# Altium footprint library SMDLibrary.PcbLib: 309 footprints (part 5 of 20)
Each footprint in its own frame and in the unit in brackets; x right, y up, seen from the top. Pads: shape width x height; smd on the part's side, far side on the other; paste and mask are expansions set on the pad; w line width, h text height; cw(c..) or ccw(c..) is an arc to the next point about the centre after c.
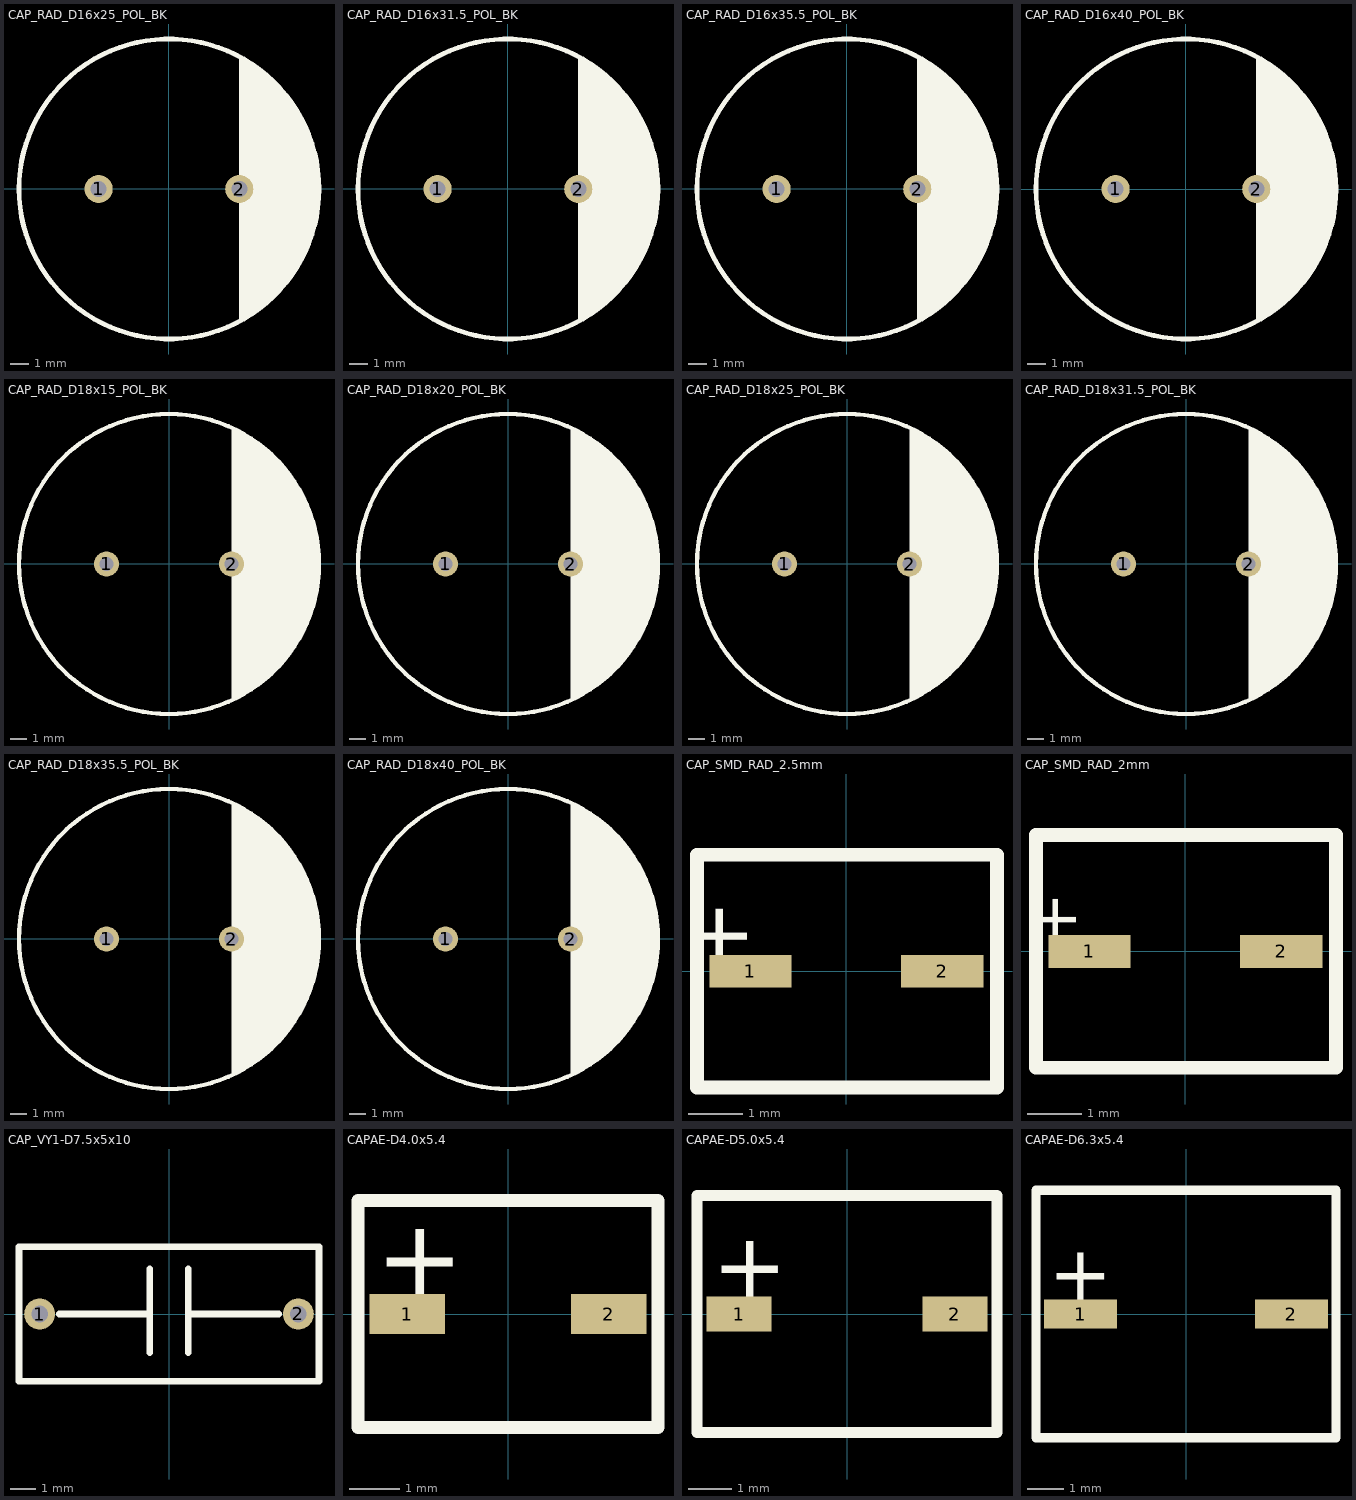
[diagram p4: the footprints below, top view; thin cyan lines are the x and y axes]

## CAP_RAD_D16x25_POL_BK [mm]
pads (2):
  round 1.5 hole 0.85: 1(-3.75,0) 2(3.75,0)
Top Overlay:
  circle w0.254: c0,0 r8
  region: 1.3,2.25
  region: 3.75,7.094 3.75,-7.058 4.067,-6.882 4.669,-6.476 5.232,-6.019 5.754,-5.514 6.229,-4.965 6.653,-4.377 7.025,-3.753 7.34,-3.1 7.597,-2.421 7.793,-1.722 7.927,-1.009 7.997,-0.287 8.001,0.076 7.995,0.435 7.919,1.148 7.781,1.851 7.583,2.54 7.324,3.209 7.008,3.852 6.636,4.465 6.213,5.043 5.74,5.582 5.221,6.078 4.662,6.525 4.065,6.923
3D body "CAP_RAD_D16x25_POL_BK.stp": height 27, standoff -2.5, extent -8.25,-8.25 8.25,8.25

## CAP_RAD_D16x31.5_POL_BK [mm]
pads (2):
  round 1.5 hole 0.85: 1(-3.75,0) 2(3.75,0)
Top Overlay:
  circle w0.254: c0,0 r8
  region: 3.75,7.094 3.75,-7.058 4.067,-6.882 4.669,-6.476 5.232,-6.019 5.754,-5.514 6.228,-4.965 6.653,-4.377 7.025,-3.753 7.34,-3.1 7.597,-2.421 7.793,-1.722 7.927,-1.009 7.997,-0.287 8.001,0.076 7.995,0.435 7.919,1.148 7.781,1.851 7.583,2.54 7.324,3.209 7.008,3.852 6.636,4.465 6.213,5.043 5.74,5.582 5.221,6.078 4.662,6.525 4.065,6.923
  region: 1.3,2.25
3D body "CAP_RAD_D16x31.5_POL_BK.stp": height 33.5, standoff -2.5, extent -8.25,-8.247 8.25,8.247

## CAP_RAD_D16x35.5_POL_BK [mm]
pads (2):
  round 1.5 hole 0.85: 1(-3.75,0) 2(3.75,0)
Top Overlay:
  circle w0.254: c0,0 r8
  region: 3.75,7.094 3.75,-7.058 4.067,-6.882 4.669,-6.476 5.232,-6.019 5.754,-5.514 6.229,-4.965 6.653,-4.377 7.025,-3.753 7.34,-3.1 7.597,-2.421 7.793,-1.722 7.927,-1.009 7.997,-0.287 8.001,0.076 7.995,0.435 7.919,1.148 7.781,1.851 7.583,2.54 7.324,3.209 7.008,3.852 6.636,4.465 6.213,5.043 5.74,5.582 5.221,6.078 4.662,6.525 4.065,6.923
  region: 1.3,2.25
3D body "CAP_RAD_D16x35.5_POL_BK.stp": height 37.5, standoff -2.5, extent -8.25,-8.246 8.25,8.246

## CAP_RAD_D16x40_POL_BK [mm]
pads (2):
  round 1.5 hole 0.85: 1(-3.75,0) 2(3.75,0)
Top Overlay:
  circle w0.254: c0,0 r8
  region: 3.75,7.094 3.75,-7.058 4.068,-6.882 4.669,-6.476 5.233,-6.019 5.754,-5.514 6.229,-4.965 6.653,-4.376 7.025,-3.753 7.34,-3.099 7.597,-2.421 7.793,-1.722 7.927,-1.009 7.998,-0.286 8.001,0.076 7.995,0.435 7.919,1.148 7.782,1.851 7.583,2.54 7.324,3.209 7.008,3.852 6.636,4.465 6.213,5.044 5.74,5.582 5.221,6.078 4.662,6.526 4.065,6.923
  region: 1.3,2.25
3D body "CAP_RAD_D16x40_POL_BK.stp": height 42, standoff -2.5, extent -8.25,-8.248 8.25,8.248

## CAP_RAD_D18x15_POL_BK [mm]
pads (2):
  round 1.5 hole 0.85: 1(-3.75,0) 2(3.75,0)
Top Overlay:
  circle w0.254: c0,0 r9
  region: 1.3,2.25
  region: 3.75,8.179 3.75,-8.179 4.137,-7.996 4.874,-7.559 5.566,-7.054 6.208,-6.487 6.793,-5.861 7.316,-5.183 7.773,-4.458 8.16,-3.694 8.472,-2.896 8.708,-2.073 8.866,-1.231 8.943,-0.378 8.941,0.051 8.94,0.475 8.859,1.321 8.699,2.154 8.46,2.969 8.146,3.758 7.758,4.513 7.301,5.229 6.779,5.898 6.196,6.515 5.557,7.074 4.868,7.571 4.135,8
3D body "CAP_RAD_D18x15_POL_BK.stp": height 16.5, standoff -2.5, extent -9.25,-9.25 9.25,9.25

## CAP_RAD_D18x20_POL_BK [mm]
pads (2):
  round 1.5 hole 0.85: 1(-3.75,0) 2(3.75,0)
Top Overlay:
  circle w0.254: c0,0 r9
  region: 1.3,2.25
  region: 3.75,8.179 3.75,-8.179 4.137,-7.996 4.874,-7.559 5.566,-7.054 6.208,-6.487 6.793,-5.861 7.316,-5.183 7.773,-4.458 8.16,-3.694 8.472,-2.896 8.708,-2.073 8.866,-1.231 8.943,-0.378 8.941,0.051 8.94,0.475 8.859,1.32 8.699,2.154 8.46,2.969 8.146,3.758 7.758,4.513 7.301,5.229 6.779,5.898 6.196,6.515 5.557,7.074 4.868,7.571 4.135,8
3D body "CAP_RAD_D18x20_POL_BK.stp": height 22, standoff -2.5, extent -9.25,-9.25 9.25,9.25

## CAP_RAD_D18x25_POL_BK [mm]
pads (2):
  round 1.5 hole 0.85: 1(-3.75,0) 2(3.75,0)
Top Overlay:
  circle w0.254: c0,0 r9
  region: 1.3,2.25
  region: 3.75,8.179 3.75,-8.179 4.137,-7.996 4.874,-7.559 5.566,-7.054 6.208,-6.487 6.793,-5.861 7.316,-5.183 7.773,-4.458 8.16,-3.694 8.472,-2.896 8.708,-2.073 8.866,-1.231 8.943,-0.378 8.941,0.051 8.94,0.475 8.859,1.32 8.699,2.154 8.46,2.969 8.146,3.758 7.758,4.513 7.301,5.229 6.779,5.898 6.196,6.515 5.557,7.074 4.868,7.571 4.135,8
3D body "CAP_RAD_D18x25_POL_BK.stp": height 27, standoff -2.5, extent -9.25,-9.248 9.25,9.248

## CAP_RAD_D18x31.5_POL_BK [mm]
pads (2):
  round 1.5 hole 0.85: 1(-3.75,0) 2(3.75,0)
Top Overlay:
  circle w0.254: c0,0 r9
  region: 3.75,8.179 3.75,-8.179 4.137,-7.996 4.874,-7.559 5.566,-7.054 6.208,-6.487 6.793,-5.861 7.316,-5.183 7.773,-4.458 8.16,-3.694 8.472,-2.896 8.708,-2.073 8.866,-1.231 8.943,-0.378 8.941,0.051 8.94,0.475 8.859,1.32 8.699,2.154 8.46,2.969 8.146,3.758 7.758,4.513 7.301,5.229 6.779,5.898 6.196,6.515 5.557,7.074 4.868,7.571 4.135,8
  region: 1.3,2.25
3D body "CAP_RAD_D18x31.5_POL_BK.stp": height 33.5, standoff -2.5, extent -9.25,-9.249 9.25,9.249

## CAP_RAD_D18x35.5_POL_BK [mm]
pads (2):
  round 1.5 hole 0.85: 1(-3.75,0) 2(3.75,0)
Top Overlay:
  circle w0.254: c0,0 r9
  region: 1.3,2.25
  region: 3.75,8.179 3.75,-8.179 4.137,-7.996 4.874,-7.559 5.566,-7.054 6.208,-6.487 6.793,-5.861 7.316,-5.183 7.773,-4.458 8.16,-3.694 8.472,-2.896 8.708,-2.073 8.866,-1.231 8.943,-0.378 8.941,0.051 8.94,0.475 8.859,1.32 8.699,2.154 8.46,2.969 8.146,3.758 7.758,4.513 7.301,5.229 6.779,5.898 6.196,6.515 5.557,7.074 4.868,7.571 4.135,8
3D body "CAP_RAD_D18x35.5_POL_BK.stp": height 37.5, standoff -2.5, extent -9.25,-9.246 9.25,9.247

## CAP_RAD_D18x40_POL_BK [mm]
pads (2):
  round 1.5 hole 0.85: 1(-3.75,0) 2(3.75,0)
Top Overlay:
  circle w0.254: c0,0 r9
  region: 3.75,8.179 3.75,-8.179 4.137,-7.996 4.874,-7.559 5.566,-7.054 6.208,-6.487 6.793,-5.861 7.316,-5.183 7.773,-4.458 8.16,-3.694 8.472,-2.896 8.708,-2.073 8.866,-1.231 8.943,-0.378 8.941,0.051 8.94,0.475 8.859,1.32 8.699,2.154 8.46,2.969 8.146,3.758 7.758,4.513 7.301,5.229 6.779,5.898 6.196,6.515 5.557,7.074 4.868,7.571 4.135,8
  region: 1.3,2.25
3D body "CAP_RAD_D18x40_POL_BK.stp": height 42, standoff -2.5, extent -9.25,-9.245 9.25,9.246

## CAP_SMD_RAD_2.5mm [mm]
pads (2):
  rect 1.5x0.6 smd: 1(-1.75,0) 2(1.75,0)
Top Layer:
  region: 0.8,1.8
Top Overlay:
  lines w0.254: -2.725,-2.125 -2.725,2.125 2.75,2.125 2.75,-2.125 -2.725,-2.125
  text "+" at -1.425,1.3 h2
3D body "CAPSMD10-16.stp": height 5.84, standoff 0, extent -2.5,-2.13 2.5,2.13

## CAP_SMD_RAD_2mm [mm]
pads (2):
  rect 1.5x0.6 smd: 1(-1.75,0) 2(1.75,0)
Top Layer:
  region: 0.8,1.8
Top Overlay:
  lines w0.254: -2.725,-2.125 2.75,-2.125 2.75,2.125 -2.725,2.125 -2.725,-2.125
  text "+" at -1.7,1.075 h1.5
3D body "CAPSMD4.7-50.stp": height 5.84, standoff 0, extent -2.5,-2.13 2.5,2.13

## CAP_VY1-D7.5x5x10 [mm]
pads (2):
  round 1.2 hole 0.65: 1(-5,0) 2(5,0)
Top Overlay:
  lines w0.254: -4.25,0 -0.75,0 ; -0.75,-1.5 -0.75,1.75 ; 0.75,-1.5 0.75,1.75 ; 0.75,0 4.25,0 ; -5.8,-2.6 5.8,-2.6 5.8,2.6 -5.8,2.6 -5.8,-2.6
3D body "VY1-D7.5x5x10.stp": height 11.5, standoff -2.5, extent -5.595,-2.499 5.595,2.499

## CAPAE-D4.0x5.4 [mm]
pads (2):
  rect 1.5x0.8 smd: 1(-2,0) 2(2,0)
Top Overlay:
  lines w0.254: -2.975,-2.25 2.975,-2.25 2.975,2.25 -2.975,2.25 -2.975,-2.25
  text "+" at -2.625,0.375 h1.52
3D body "CAPAE-D4.0x5.4.stp": height 5.5, standoff 0, extent -2.75,-2.25 2.75,2.25

## CAPAE-D5.0x5.4 [mm]
pads (2):
  rect 1.5x0.8 smd: 1(-2.5,0) 2(2.5,0)
Top Overlay:
  lines w0.254: -3.475,-2.75 3.475,-2.75 3.475,2.75 -3.475,2.75 -3.475,-2.75
  text "+" at -3.125,0.375 h1.52
3D body "CAPAE-D5.0x5.4.stp": height 5.5, standoff 0, extent -3.25,-2.75 3.25,2.75

## CAPAE-D6.3x5.4 [mm]
pads (2):
  rect 2x0.8 smd: 1(-2.9,0) 2(2.9,0)
Top Overlay:
  lines w0.254: -4.125,-3.4 4.125,-3.4 4.125,3.4 -4.125,3.4 -4.125,-3.4
  text "+" at -3.775,0.375 h1.52
3D body "CAPAE-D6.3x5.4.stp": height 5.5, standoff 0, extent -3.9,-3.4 3.9,3.4